# Altium footprint library UP-ROBOT Devices(2013-02-26).PcbLib: 150 footprints (part 3 of 10)
Each footprint in its own frame and in the unit in brackets; x right, y up, seen from the top. Pads: shape width x height; smd on the part's side, far side on the other; paste and mask are expansions set on the pad; w line width, h text height; cw(c..) or ccw(c..) is an arc to the next point about the centre after c.
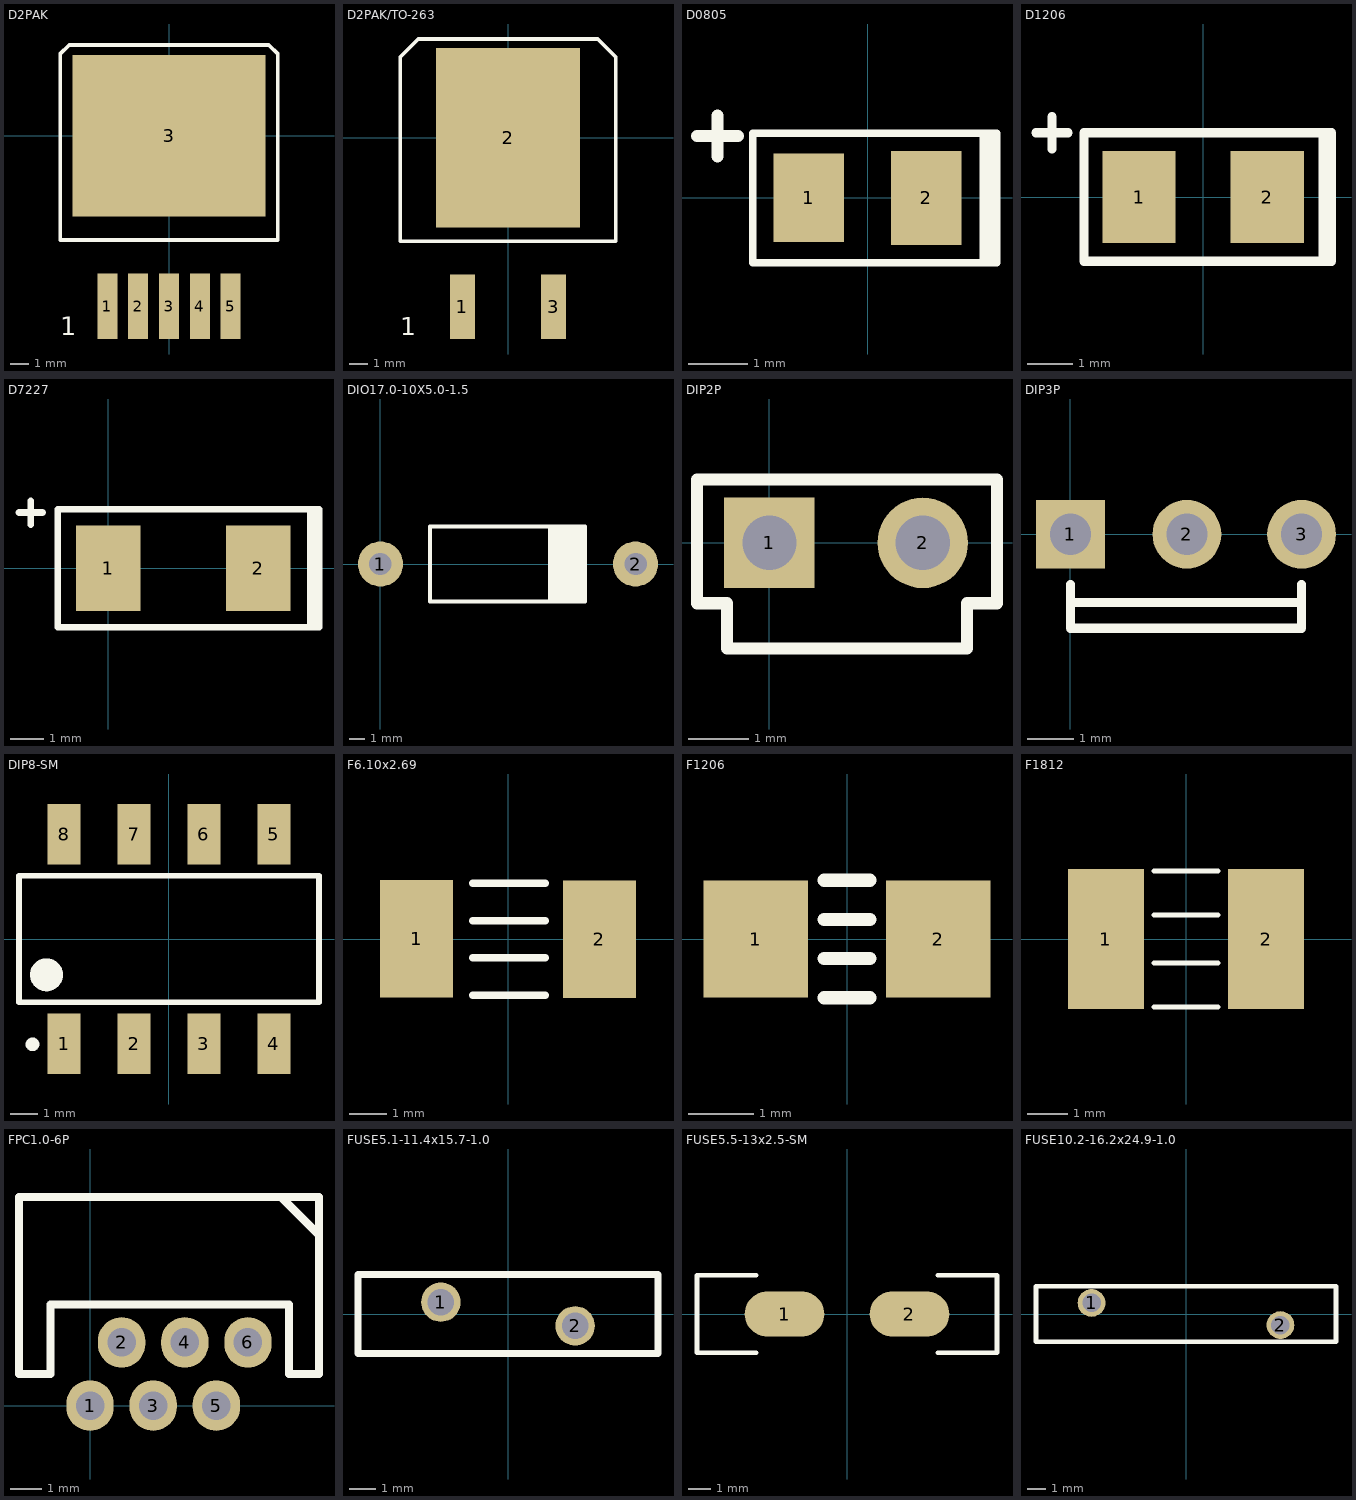
[diagram p2: the footprints below, top view; thin cyan lines are the x and y axes]

## D2PAK [mm] "LM2576\2596"
pads (6):
  rect 1.1x3.6 smd: 1(-3.4,-9.4) 2(-1.7,-9.4) 3(0,-9.4) 4(1.7,-9.4) 5(3.4,-9.4)
  rect 10.66x8.9 smd: 3(0,0)
Top Overlay:
  lines w0.203: -6,-5.75 6,-5.75 6,4.5 5.5,5 -0.5,5 -5.5,5 -6,4.5 -6,-5.75
  text "1" at -6,-11 h1.02
3D body: height 4.5, standoff 0, extent -5.219,-10.45 5.219,4.25

## D2PAK/TO-263 [mm] "LM2576\2596"
pads (3):
  rect 1.4x3.6 smd: 1(-2.54,-9.4) 3(2.54,-9.4)
  rect 8x10 smd: 2(0,0)
Top Overlay:
  lines w0.203: -6,-5.75 -6,4.5 -5,5.5 0,5.5 5,5.5 6,4.5 6,-5.75 -6,-5.75
  text "1" at -6,-11 h1.02
3D body: height 4.5, standoff 0, extent -5.219,-10.45 5.219,4.25

## D0805 [mm]
height 3.6
pads (2):
  rect 1.2x1.5 smd: 1(-1,0)
  rect 1.2x1.6 smd: 2(1,0)
Top Overlay:
  rectangle: 1.9,-1.1 2.154,1.1
  lines w0.127: 1.978,-1.016 1.978,1.016 ; -1.95,-1.1 -1.95,1.1 2.2,1.1 2.2,-1.1 -1.95,-1.1
  lines w0.203: -2.9,1.05 -2.55,1.05 ; -2.55,0.7 -2.55,1.05 ; -2.55,1.4 -2.55,1.05 ; -2.2,1.05 -2.55,1.05

## D1206 [mm]
pads (2):
  rect 1.6x2 smd: 1(-1.4,0) 2(1.4,0)
Top Overlay:
  rectangle: 2.519,-1.35 2.9,1.35
  lines w0.203: -3.65,1.4 -3.3,1.4 ; -3.3,1.05 -3.3,1.4 ; -3.3,1.75 -3.3,1.4 ; -2.95,1.4 -3.3,1.4 ; -2.6,-1.4 2.8,-1.4 2.8,1.4 -2.6,1.4 -2.6,-1.4
3D body: height 1.6, standoff 0, extent -1.75,-0.8 1.95,0.8

## D7227 [mm]
pads (2):
  rect 1.905x2.54 smd: 1(0,0) 2(4.445,0)
Top Overlay:
  rectangle: 6,-1.75 6.25,1.75
  lines w0.203: -2.65,1.65 -2.3,1.65 ; -2.3,1.3 -2.3,1.65 ; -2.3,2 -2.3,1.65 ; -1.95,1.65 -2.3,1.65 ; 5.75,-1.75 6.25,-1.75 6.25,1.75 6,1.75 ; 6,1.75 6,-1.75 -1.5,-1.75 -1.5,1.75 6,1.75

## DIO17.0-10X5.0-1.5 [mm]
pads (2):
  round 3 hole 1.5: 1(0,0) 2(17,0)
Top Overlay:
  rectangle: 11.176,-2.5 13.636,2.5
  lines w0.254: 3.3,-2.5 13.636,-2.5 13.636,2.5 3.3,2.5 3.3,-2.5

## DIP2P [mm] "FOR IR928-6C"
pads (2):
  rect 1.5x1.5 hole 0.9: 1(0,0)
  round 1.5 hole 0.9: 2(2.54,0)
Top Overlay:
  lines w0.2: -1.2,-1 -0.7,-1 -0.7,-1.75 3.27,-1.75 3.27,-1 3.77,-1 3.77,1.05 -1.2,1.05 -1.2,-1
3D body: height 7.54, standoff -2.54, extent -0.96,-2.315 3.48,0.8

## DIP3P [mm] "FOR MID-95A3L"
pads (3):
  rect 1.5x1.5 hole 0.9: 1(0,0)
  round 1.5 hole 0.9: 2(2.54,0) 3(5.04,0)
Top Overlay:
  lines w0.2: 0,-1.49 5.04,-1.49 ; 0,-1.1 0,-2.05 5.04,-2.05 5.04,-1.1
3D body: height 7.5, standoff -2.5, extent -0.2,-1.75 5.38,1.25

## DIP8-SM [mm]
pads (8):
  rect 1.2x2.2 smd: 1(-3.81,-3.8) 2(-1.27,-3.8) 3(1.27,-3.8) 4(3.81,-3.8) 5(3.81,3.8) 6(1.27,3.8) 7(-1.27,3.8) 8(-3.81,3.8)
Top Overlay:
  circle w0.6: c-4.45,-1.3 r0.3
  circle w0.25: c-4.96,-3.827 r0.125
  lines w0.2: -5.45,-2.3 5.45,-2.3 5.45,2.3 -5.45,2.3 -5.45,-2.3

## F6.10x2.69 [mm] "Fuse - Fast-Acting Lead-Free Glass Body"
height 2.69
pads (2):
  rect 1.96x3.15 smd: 1(-2.452,0.01) 2(2.452,0)
Top Overlay:
  lines w0.203: -0.95,-1.5 1,-1.5 ; -0.95,-0.5 1,-0.5 ; -0.95,0.5 1,0.5 ; -0.95,1.5 1,1.5
3D body: height 2.69, standoff 0, extent -3.05,-1.345 3.05,1.345

## F1206 [mm]
pads (2):
  rect 1.6x1.8 smd: 1(-1.4,0) 2(1.4,0)
Top Overlay:
  lines w0.203: -0.35,-0.9 0.35,-0.9 ; -0.35,-0.3 0.35,-0.3 ; -0.35,0.3 0.35,0.3 ; -0.35,0.9 0.35,0.9
3D body: height 0.61, standoff 0, extent -1.524,-0.818 1.524,0.711

## F1812 [mm]
pads (2):
  rect 1.9x3.5 smd: 1(-2,0) 2(2,0)
Top Overlay:
  lines w0.127: -0.8,-1.7 0.8,-1.7 ; -0.8,-0.6 0.8,-0.6 ; -0.8,0.6 0.8,0.6 ; -0.8,1.7 0.8,1.7
3D body: height 0.69, standoff -0.01, extent -2.286,-1.651 2.314,1.649

## FPC1.0-6P [mm]
pads (6):
  oval 1.5x1.6 hole 0.9: 1(0,0) 2(1,2) 3(2,0) 4(3,2) 5(4,0) 6(5,2)
Top Overlay:
  lines w0.254: 6.075,6.575 7.25,5.4 ; -2.25,1 -2.25,6.6 7.25,6.6 7.25,1 6.3,1 6.3,3.2 -1.25,3.2 -1.25,1 -2.25,1
3D body: height 3.01, standoff -0.74, extent -2,-0.05 7,7.05

## FUSE5.1-11.4x15.7-1.0 [mm]
pads (2):
  round 1.5 hole 1: 1(-2.55,0.45) 2(2.55,-0.45)
Top Overlay:
  lines w0.254: -5.7,-1.5 5.7,-1.5 5.7,1.5 -5.7,1.5 -5.7,-1.5
3D body: height 17.3, standoff -4, extent -5.7,-1.5 5.7,1.5

## FUSE5.5-13x2.5-SM [mm]
pads (2):
  oval 3.5x2 smd: 1(-2.75,0) 2(2.75,0)
Top Overlay:
  lines w0.203: -4,-1.7 -6.6,-1.7 -6.6,1.7 -4,1.7 ; 4,-1.7 6.6,-1.7 6.6,1.7 4,1.7

## FUSE10.2-16.2x24.9-1.0 [mm]
pads (2):
  round 1.5 hole 1: 1(-5.1,0.6) 2(5.1,-0.6)
Top Overlay:
  lines w0.254: -8.1,-1.5 -8.1,1.5 8.1,1.5 8.1,-1.5 -8.1,-1.5
3D body: height 25.1, standoff -3.9, extent -8.2,-1.5 8.3,1.5